# Altium footprint library Capacitor.PcbLib: 37 footprints (part 3 of 3)
Each footprint in its own frame and in the unit in brackets; x right, y up, seen from the top. Pads: shape width x height; smd on the part's side, far side on the other; paste and mask are expansions set on the pad; w line width, h text height; cw(c..) or ccw(c..) is an arc to the next point about the centre after c.
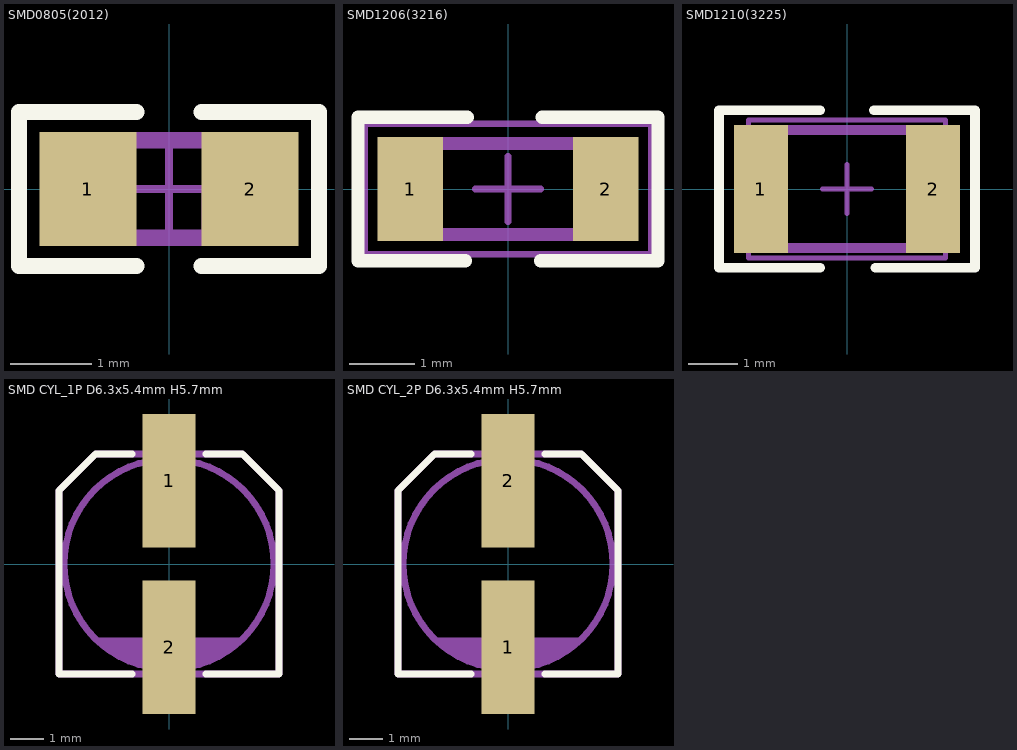
[diagram p2: the footprints below, top view; thin cyan lines are the x and y axes]

## SMD0805(2012) [mm]
height 1.2
pads (2):
  rect 1.2x1.4 smd: 1(-1,0) 2(1,0)
Top Overlay:
  lines w0.2: -0.4,-0.95 -1.85,-0.95 -1.85,0.95 -0.4,0.95 ; 0.4,-0.95 1.8,-0.95 ; 0.4,0.95 1.8,0.95 ; 1.85,-0.95 1.85,0.95
Top Assy:
  lines w0.2: -0.508,-0.6 -0.508,0.6 ; 0.5,-0.6 0.508,0.6 ; -1,-0.6 1,-0.6 1,0.6 -1,0.6 -1,-0.6
  text "'.Designator'" at -1.9,1.1 h1
Area:
  lines w0.1: -0.5,0 0.5,0 ; 0,-0.5 0,0.5
3D body "0805 SMD Capacitor.step": height 0.78, standoff 0, extent -1,-0.625 1,0.625

## SMD1206(3216) [mm]
height 0.6
pads (2):
  rect 1x1.6 smd: 1(-1.5,0) 2(1.5,0)
Top Overlay:
  lines w0.2: -0.65,-1.1 -2.3,-1.1 -2.3,1.1 -0.625,1.1 ; 0.5,-1.1 2.3,-1.1 2.3,1.1 0.525,1.1
Top Assy:
  lines w0.2: -1.175,-0.7 -1.175,0.7 ; 1.175,-0.7 1.175,0.7 ; -1.6,-0.7 -1.6,0.7 1.6,0.7 1.6,-0.7 -1.6,-0.7
  text "'.Designator'" at -0.975,1.275 h1
Area:
  lines w0.1: -0.5,0 0.5,0 ; 0,-0.5 0,0.5 ; -2.2,-1 2.2,-1 2.2,1 -2.2,1 -2.2,-1
3D body "SW3dPS-1206 SMD Capacitor.STEP": height 1, standoff 0, extent -1.6,-0.8 1.6,0.8

## SMD1210(3225) [mm]
height 2.5
pads (2):
  rect 1.1x2.6 smd: 1(-1.75,0) 2(1.75,0)
Top Overlay:
  lines w0.2: -0.55,-1.6 -2.6,-1.6 -2.6,1.6 -0.55,1.6 ; 0.55,1.6 2.6,1.6 2.6,-1.6 0.575,-1.6
Top Assy:
  lines w0.2: -1.475,-1.2 -1.475,1.2 ; 1.45,-1.2 1.45,1.2 ; -2,-1.2 2,-1.2 2,1.2 -2,1.2 -2,-1.2
  text "'.Designator'" at -0.6,-0.2 h1
Area:
  lines w0.1: -0.5,0 0.5,0 ; 0,-0.5 0,0.5 ; -2,-1.4 -2,1.4 2,1.4 2,-1.4 -2,-1.4
3D body "User Library-1210(3225M) Cap.STEP": height 1.7, standoff 0, extent -2,-1.244 2,1.245

## SMD CYL_1P D6.3x5.4mm H5.7mm [mm]
height 5.7
pads (2):
  rect 1.6x4 smd: 1(0,2.5) 2(0,-2.5)
Top Overlay:
  lines w0.2: -1.1,-3.3 -3.3,-3.3 -3.3,2.2 -2.2,3.3 -1.1,3.3 ; 1.1,-3.3 3.3,-3.3 3.3,2.2 2.2,3.3 1.1,3.3
Top Assy:
  circle w0.2: c0,0 r3.15
  region: -0.925,-3.025 -0.85,-3.05 -0.7,-3.075 -0.5,-3.125 -0.3,-3.15 -0.1,-3.15 0,-3.15 0.1,-3.15 0.35,-3.15 0.525,-3.125 0.7,-3.075 0.825,-3.05 0.95,-3 1.125,-2.95 1.25,-2.9 1.325,-2.875 1.4,-2.825 1.5,-2.75 1.6,-2.7 1.9,-2.5 2.15,-2.3 1.1,-2.3 0.6,-2.3 -0.15,-2.3 -2.15,-2.3 -1.85,-2.55 -1.5,-2.775 -1.25,-2.9 -1.05,-2.975
  lines w0.2: -2.15,-2.3 2.15,-2.3 ; -3.3,-3.3 -3.3,2.2 -2.2,3.3 2.2,3.3 3.3,2.2 3.3,-3.3 -3.3,-3.3
  text "+" at -1.8,1.65 h2
  text "'.Designator'" at -2.9,-0.3 h1
3D body "CYL D6.3x5.4 Al Capacitor.step": height 5.55, standoff 0, extent -3.25,-3.3 3.35,3.3

## SMD CYL_2P D6.3x5.4mm H5.7mm [mm]
height 5.7
pads (2):
  rect 1.6x4 smd: 1(0,-2.5) 2(0,2.5)
Top Overlay:
  lines w0.2: -1.1,-3.3 -3.3,-3.3 -3.3,2.2 -2.2,3.3 -1.1,3.3 ; 1.1,-3.3 3.3,-3.3 3.3,2.2 2.2,3.3 1.1,3.3
Top Assy:
  circle w0.2: c0,0 r3.15
  region: -0.925,-3.025 -0.85,-3.05 -0.7,-3.075 -0.5,-3.125 -0.3,-3.15 -0.1,-3.15 0,-3.15 0.1,-3.15 0.35,-3.15 0.525,-3.125 0.7,-3.075 0.825,-3.05 0.95,-3 1.125,-2.95 1.25,-2.9 1.325,-2.875 1.4,-2.825 1.5,-2.75 1.6,-2.7 1.9,-2.5 2.15,-2.3 1.1,-2.3 0.6,-2.3 -0.15,-2.3 -2.15,-2.3 -1.85,-2.55 -1.5,-2.775 -1.25,-2.9 -1.05,-2.975
  lines w0.2: -2.15,-2.3 2.15,-2.3 ; -3.3,-3.3 -3.3,2.2 -2.2,3.3 2.2,3.3 3.3,2.2 3.3,-3.3 -3.3,-3.3
  text "+" at -1.8,1.65 h2
  text "'.Designator'" at -2.9,-0.3 h1
3D body "CYL D6.3x5.4 Al Capacitor.step": height 5.55, standoff 0, extent -3.25,-3.3 3.35,3.3